# Altium integrated library C210 Rev_D.IntLib: 99 symbols (part 2 of 2)
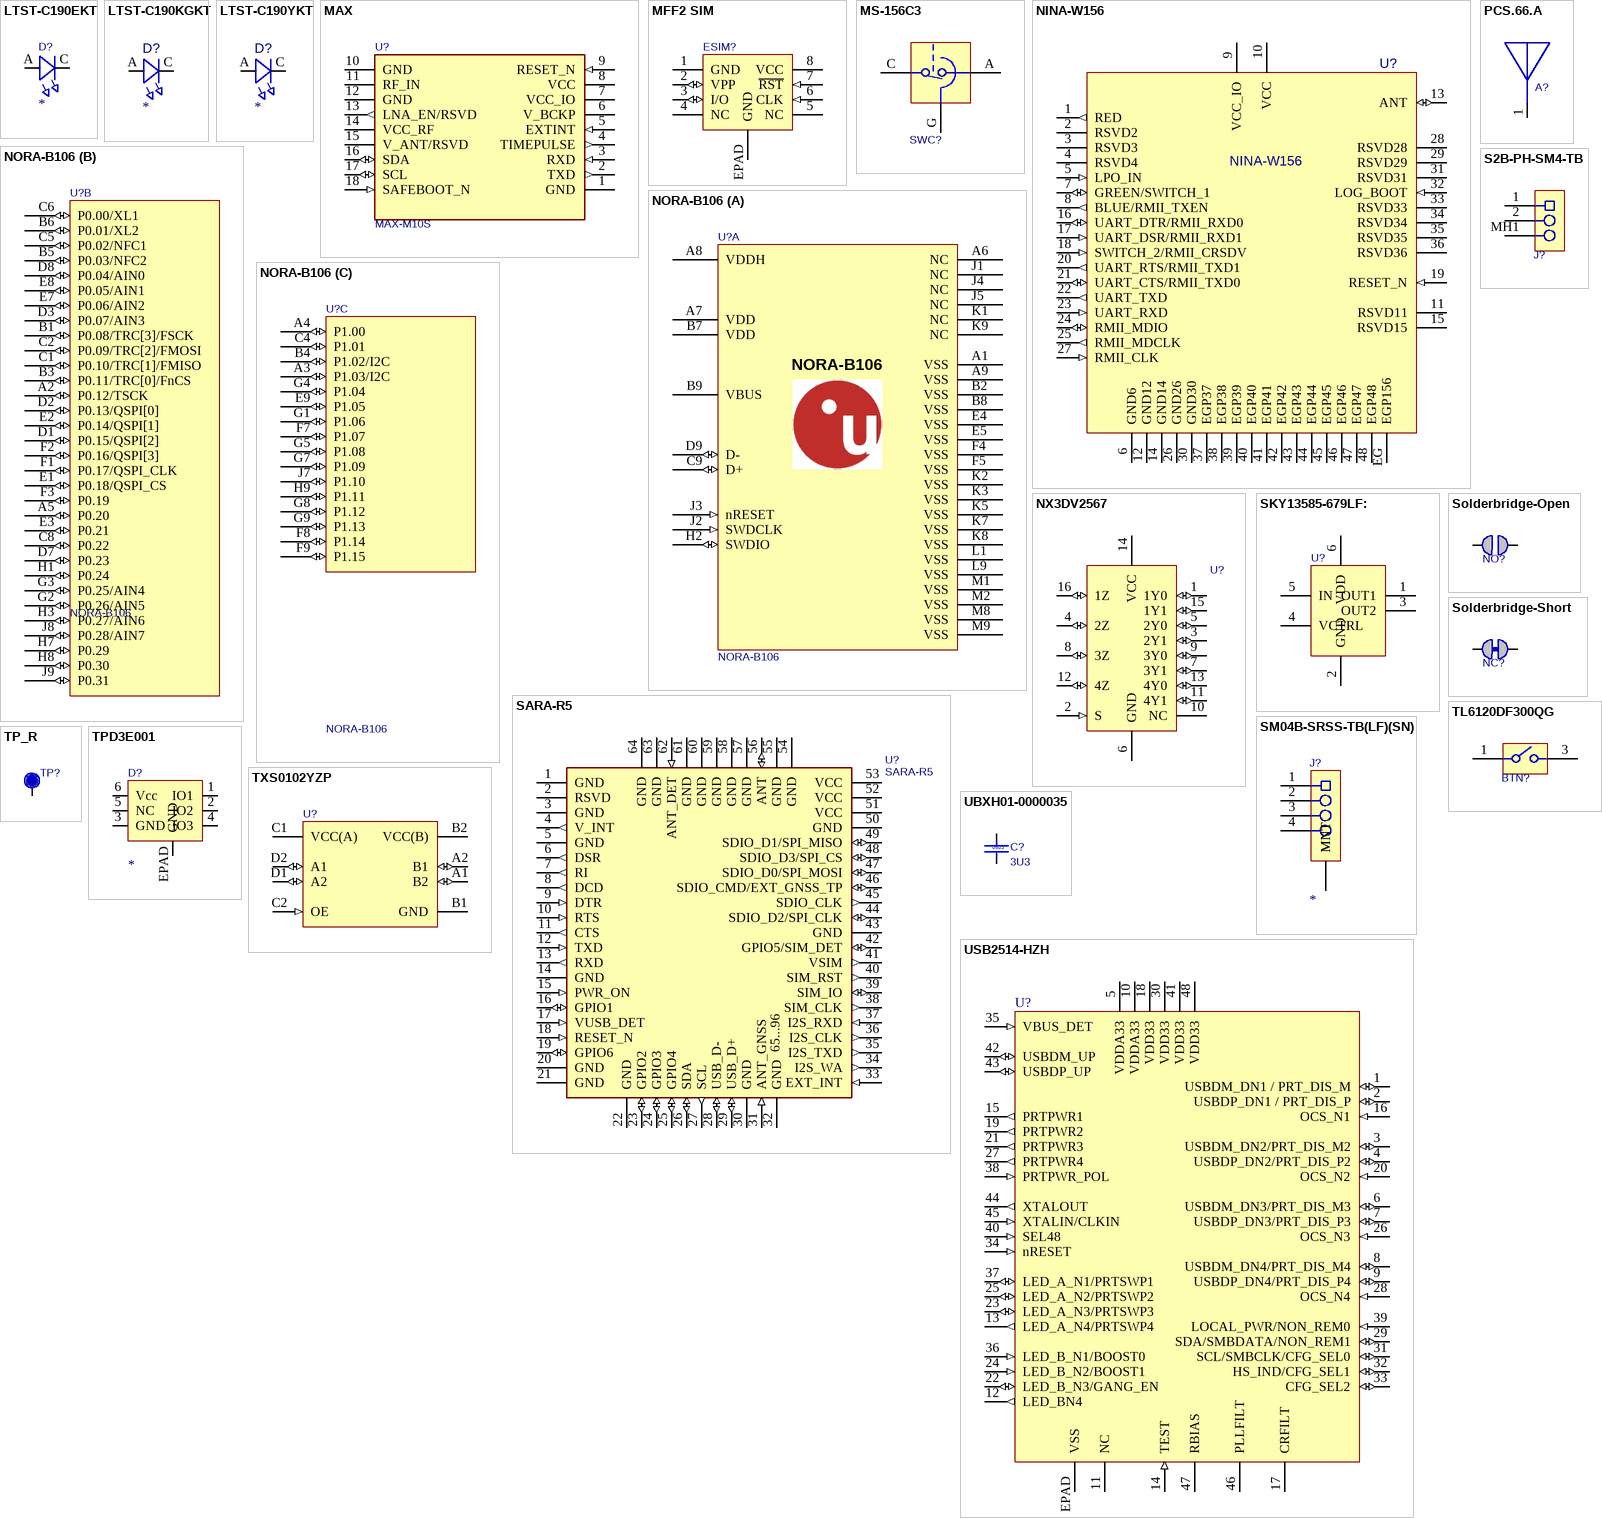
[diagram p3: symbols LTST-C190EKT to USB2514-HZH]

## NX3DV2567
designator U?
IC, ANLG SWITCH, 4PDT, SIM OPTIMIZED, 1.4V-4.3V, SMT, XQFN-16, 2.6mmX1.8mm; Part Number: NX3DV2567; Manufacturer 1: NXP USA Inc.; Manufacturer Part Number 1: NX3DV2567GU,115; Current: None; Item Phase: In Production; Use in new designs: Yes; Body Size: 2.6mm x 1.8mm; Height: 1mm; MFG Package: XQFN-16; Max Operating Temp: 85; Min Operating Temp: -40; Part Name: NX3DV2567GU,115; Pins: 16; Revision: 0A; Voltage: 1.4V-4.3V; UBX Code: None
footprint XQFN-16 (XQFN-16 0.4mm Pitch, 16 Pin, 2.6mm x 1.8mm)
pins: 1 1Y0 (io) "independent input or output (supply switch)", 2 S (in) "Control Input", 3 2Y1 (io) "independent input or output (data switch)", 4 2Z (io) "common output or input (data switch)", 5 2Y0 (io) "independent input or output (data switch)", 6 GND (power) "Ground", 7 3Y1 (io) "independent input or output (data switch)", 8 3Z (io) "common output or input (data switch)", 9 3Y0 (io) "independent input or output (data switch)", 10 NC "No Connect", 11 4Y1 (io) "independent input or output (data switch)", 12 4Z (io) "common output or input (data switch)", 13 4Y0 (io) "independent input or output (data switch)", 14 VCC (power) "Power Supply", 15 1Y1 (io) "independent input or output (supply switch)", 16 1Z (io) "common output or input (supply switch)"

## PCS.66.A
designator A?  (value not drawn)
RF Passive, Antenna, LTE, 600-6000MHz, Monopole; Manufacturer 1: Taoglas; Body Size: 33mm x 25mm; Item Phase: Unreleased; MFG Package: Custom; RF Freq: 698-2700 MHz; SMT Pitch: None; Use in new designs: Yes; Part Number: PCS.66.A; Manufacturer Part Number 1: PCS.66.A; Height: 1.6mm; Max Operating Temp: 85; Min Operating Temp: -40; Pins: 5; Revision: None; Size: Other; Voltage: None; UBX Code: None; Manufacturer 2: None; Manufacturer Part Number 2: None; Supplier 2: None; Supplier Part Number 2: None
footprint PCS.66.A (Taoglas PCS.66.A Cellular Antenna, 33x25x1.6mm)
pins: 1 "Feed"

## S2B-PH-SM4-TB
designator J?
Conn, SMT, 0.079" Pitch, 2 Pin, R/A, Black; Part Number: S2B-PH-SM4-TB; Item Phase: In Production; Use in new designs: Yes; Voltage: None; Manufacturer Part Number 1: S2B-PH-SM4-TB; Supplier 1: None; Supplier Part Number 1: None; Diameter: None; Height: 5.5mm; Max Operating Temp: None; Min Operating Temp: None; Part Name: Conn, SMT, 0.079" Pitch, 2 Pin, R/A, Black; Pins: 2; Revision: 0A; UBX Code: None; Manufacturer 2: None; Manufacturer Part Number 2: None; Supplier 2: None; Supplier Part Number 2: None; Manufacturer P/N: *
footprint S2B-PH-SM4-TB (Connector Header Surface Mount, Right Angle 2 position 0.079" (2.00mm))
pins: 1, 2, MH1

## SARA-R5
designator U?
GSM/GPRS and GSM/EGPRS/HSPA Cellular Module; Manufacturer: u-blox; Part Description: GSM/EGPRS/HSPA module; Manufacturer Part Number 1: SARA-R510S-01B-00; Value: SARA-R5; Manufacturer 1: u-blox
footprint SARA-XX (GSM/GPRS and GSM/EGPRS/HSPA   Cellular Module)
pins: 1 GND (power) "Ground", 2 RSVD "Reserved pin, Leave un-connected", 3 GND (power) "Ground", 4 V_INT (out) "Generic Digital Interfaces supply output", 5 GND (power) "Ground", 6 DSR (out) "UART data set ready/AUX UART request to send", 7 RI (out) "UART ring indicator / AUX UART clear to send", 8 DCD (out) "UART data carrier detect / AUX UART Output", 9 DTR (in) "UART Data Terminal Ready / AUX Uart data input", 10 RTS (in) "UART request to send", 11 CTS (out) "UART clear to send", 12 TXD (in) "UART data input", 13 RXD (out) "UART data output", 14 GND (power) "Ground", 15 PWR_ON (in) "Power on input, internal active pull-up", 16 GPIO1 (io) "Configurable GPIO", 17 VUSB_DET (in) "USB detect input", 18 RESET_N (in) "External reset input, internal active pull-up", 19 GPIO6 (io) "GPIO / Time pulse output", 20 GND (power) "Ground", 21 GND (power) "Ground", 22 GND (power) "Ground", 23 GPIO2 (io) "Configurable GPIO", 24 GPIO3 (io) "Configurable GPIO", 25 GPIO4 (io) "Configurable GPIO / External GNSS timestamp of external input", 26 SDA (io) "I2C bus data line", 27 SCL (out) "I2C bus clock line", 28 USB_D- (io) "USB data line D-", 29 USB_D+ (io) "USB data line D+", 30 GND (power) "Ground", 31 ANT_GNSS (in) "GNSS Antenna input", 32 GND (power) "Ground", 33 EXT_INT (in) "External input", 34 I2S_WA (out) "I2S word alignment / pin for dynamic tuning", 35 I2S_TXD (out) "I2S transmit data / pin for dynamic tuning", 36 I2S_CLK (out) "I2S Clock output", 37 I2S_RXD (in) "I2S receive data", 38 SIM_CLK (out) "SIM clock", 39 SIM_IO (io) "SIM bidirectional data", 40 SIM_RST (out) "SIM reset", 41 VSIM (out) "SIM supply output", 42 GPIO5/SIM_DET (io) "Configurable GPIO / SIM detect input", 43 GND (power) "Ground", 44 SDIO_D2/SPI_CLK (io) "SDIO Data 2 /  SPI clock output", 45 SDIO_CLK (out) "SDIO clock", 46 SDIO_CMD/EXT_GNSS_TP (io) "SDIO command / external GNSS time pulse input", 47 SDIO_D0/SPI_MOSI (io) "SDIO serial data 0 / SPI MOSI", 48 SDIO_D3/SPI_CS (io) "SDIO serial data 3 / SPI chip select (active low)", 49 SDIO_D1/SPI_MISO (io) "SDIO serial data 1 / SPI MISO", 50 GND (power) "Ground", 51 VCC (power) "Module supply input", 52 VCC (power) "Module supply input", 53 VCC (power) "Module supply input", 54 GND (power) "Ground", 55 GND (power) "Ground", 56 ANT (io) "Cellular antenna", 57 GND (power) "Ground", 58 GND (power) "Ground", 59 GND (power) "Ground", 60 GND (power) "Ground", 61 GND (power) "Ground", 62 ANT_DET (in) "Antenna detection", 63 GND (power) "Ground", 64 GND (power) "Ground", 65 GND, 66 GND, 67 GND, 68 GND, 69 GND, 70 GND, 71 GND, 72 GND, 73 GND, 74 GND, 75 GND, 76 GND, 77 GND, 78 GND, 79 GND, 80 GND, 81 GND, 82 GND, 83 GND, 84 GND, 85 GND, 86 GND, 87 GND, 88 GND, 89 GND, 90 GND, 91 GND, 92 GND, 93 GND, 94 GND, 95 GND, 96 GND
text: 65...96

## SKY13585-679LF:
designator U?
RF SWITCH, SPDT, I2C, 3-AXIS, 3-5V, 1-6GHz, SMT, DFN-6, 1mmX1mm; Part Number: SKY13585-679LF:; Manufacturer 1: ST Micro; Part Name: LIS3MDL; Body Size: 2mm x 2mm; Current: None; Item Phase: In Production; MFG Package: LGA-12; Use in new designs: Yes; Voltage: 1.9-3.6V; Manufacturer Part Number 1: SKY13585-679LF:; Height: 1mm; Max Operating Temp: 85; Min Operating Temp: -40; Pins: 12; Revision: 0A; UBX Code: None
footprint SKY13585-679LF (LGA 0.35mm Pitch, DFN-6 w/pad 2 underpad, 6 Pin, 1.0mm x 1.0mm)
pins: 1 OUT1 "RF Port", 2 GND (power), 3 OUT2 "RF Port", 4 VCTRL (power) "DC Control Voltage", 5 IN "RF Port", 6 VDD (power) "DC Supply Voltage"

## SM04B-SRSS-TB(LF)(SN)
designator J?
Conn, Header, SMD, 1mm Pitch, 4 Pin, R/A, White; Part Number: SM04B-SRSS-TB(LF)(SN); Manufacturer 1: JST Sales America Inc.; Part Name: CONN HEADER SMD R/A 4POS 1MM; Item Phase: In Production; Use in new designs: Yes; Voltage: None; Manufacturer Part Number 1: SM04B-SRSS-TB(LF)(SN); Supplier 1: None; Supplier Part Number 1: None; Diameter: None; Height: 2.9mm; Max Operating Temp: None; Min Operating Temp: None; Pins: 4; Revision: 0A; UBX Code: None; Manufacturer 2: None; Manufacturer Part Number 2: None; Supplier 2: None; Supplier Part Number 2: None; Manufacturer P/N: *
footprint SM04B-SRSS-TB(LF)(SN) (CONN HEADER SMD R/A 4POS 1MM)
pins: 1, 2, 3, 4, M1 MNT, M2 MNT

## Solderbridge-Open
designator NO?, comment Solderbridge-OpenDNP  (value not drawn)  (no BOM)
Solderbridge-Open; Added By: Paul B; Part Number: Solderbridge-Open; Height: 0; DNP: DNP; Added Date: 12/2/2015
footprint Solderbridge-Open
pins: 1, 2

## Solderbridge-Short
designator NC?, comment Solderbridge-ShortDNP  (value not drawn)  (net tie, no BOM)
Solderbridge-Short; Added By: Paul B; Part Number: Solderbridge-Short; Height: 0; DNP: DNP; Added Date: 12/2/2015
footprint Solderbridge-Short
pins: 1, 2

## TL6120DF300QG
designator BTN?
Button, Tactile, SPST, NO, SMT, Vert; Part Number: TL6120DF300QG; Manufacturer 1: E-Switch; Part Name: CON HDR 0.1" 3 Pin 1 Row SMT R/A; Item Phase: In Production; Use in new designs: Yes; Voltage: None; Manufacturer Part Number 1: TL6120DF300QG; Supplier 1: None; Supplier Part Number 1: None; Diameter: None; Height: 3.05mm; Max Operating Temp: None; Min Operating Temp: None; Pins: 3; Revision: 0A; UBX Code: None; Manufacturer 2: E-Switch; Manufacturer Part Number 2: TL6120DF500QG; Supplier 2: None; Supplier Part Number 2: None; Manufacturer P/N: *
footprint TL6120DF300QG (Button, Tactile, SPST, NO, Surface Mount)
pins: 1, 2, 3, 4

## TP_R
designator TP?, comment TP  (value not drawn)  (no BOM)
Testpoint, Round 1.0mm Dia; Part Number: TP10R; Added By: Jeremy D; Size: 1.0mm; Height: 0; DNP: DNP; Added Date: 2/1/2015; Checked By: Paul B; Checked Date: 2/5/2015
footprint TP12R (Testpoint, Round 1.2mm Dia)
pins: 1

## TPD3E001
designator D?
TVS Diode, ESD High Speed 3-Channel Array, WSON-6, 3mmX3mm; Manufacturer 1: Texas Instruments; Manufacturer Part Number 1: TPD3E001DRSR; Part Name: Diode TVS 5V 3CH WSON-6; Current: None; Item Phase: In Production; MFG Package: WSON-6, DRS (S-PWSON-N6); Use in new designs: Yes; Voltage: 5.5V; Manufacturer 2: None; Manufacturer Part Number 2: None; Supplier 2: None; Supplier Part Number 2: None; Body Size: 3mm x 3mm; Height: 0.80mm; Max Operating Temp: 85; Min Operating Temp: -40; Pins: 6; Revision: 0A; UBX Code: None; Manufacturer P/N: *
footprint TPD3E001DRSR (TI DSR Package - WSON-6 0.95mm Pitch, 6 Pin w/ EPAD, 3.0mm x 3.0mm)
pins: 1 IO1, 2 IO2, 3 GND (power), 4 IO3, 5 NC, 6 Vcc (power), EPAD GND (power)

## TXS0102YZP
designator U?
IC, SMT, LEVEL TRANSLATOR, DUAL, BIDIRECTIONAL, DSBGA-8 1.9mmX0.9mm; Part Number: TXS0102YZP; Manufacturer 1: Texas Instruments; Manufacturer Part Number 1: TXS0102YZPT; Current: None; Item Phase: In Production; Use in new designs: Yes; Manufacturer 2: Texas Instruments; Manufacturer Part Number 2: TXS0102YZPR; Body Size: 1.9mm x 0.9mm; Height: 0.65mm; MFG Package: DSBGA-8; Max Operating Temp: 85; Min Operating Temp: -40; Part Name: TXS0102YZP; Pins: 8; Revision: 0A; Voltage: N/A; UBX Code: None
footprint TXS0102YZP (8-DSBGA, 8 pin Texas Instruments TXS0102 dual level translator, .5mm pitch, 1.9mmX0.9mm)
pins: A1 B2 (io) "Input/output B. Referenced to VCCB", A2 B1 (io) "Input/output B. Referenced to VCCB", B1 GND (power) "Ground", B2 VCC(B) (power) "B-port supply voltage. 2.3 V ≤ VCCB ≤ 5.5 V", C1 VCC(A) (power) "A-port supply voltage. 1.65 V ≤ VCCA ≤ 3.6 V and VCCA ≤ VCC", C2 OE (in) "Output enable (active High). Pull OE low to place all outputs in 3-state", D1 A2 (io) "Input/output A. Referenced to VCCA.", D2 A1 (io) "Input/output A. Referenced to VCCA."

## UBXH01-0000035
designator C?  value 3U3  Size: 0603
CAP CER X5R 0603 3U3 10% 10V; Part Number: UBXH01-0000035; Manufacturer: Murata Manufacturing Company, Ltd.; Manufacturer P/N: GRM188R61A335KE15; Editor: dario.antonaz; Released by: karel.cotic; Env: ROHS; Permitted Use: Volume Products; Perferred: PREF; Mfg P/N Status: NRND; Mfg P/N Split: 100; Mfg P/N Released: Yes; Tolerance: 10%; Max Voltage: 10V; Part Type: Capacitor; Release Data: 2011-07-12T16:43:12; UBX Wiki: https://wiki.u-blox.com/bin/view/Operations/PartDetails?index=15220; RefDes: C; Mfg P/N Datasheet: https://wiki.u-blox.com/bin/view/Generic/Docs/DocumentSummary?index=15218; Manufacturer 2: Samsung Electro-Mechanics; Manufacturer P/N 2: CL10A335KP8NNN; Mfg P/N Status 2: Active; Mfg P/N Split 2: 0; Mfg P/N Released 2: Yes; Mfg P/N Datasheet 2: https://wiki.u-blox.com/bin/view/Generic/Docs/DocumentSummary?index=28127
simulation model CAP (Semiconductor Capacitor)
signal-integrity model Cap Semi
footprint Cap 0603 HD
footprint Cap 0603
pins: 1, 2

## USB2514-HZH
designator U?
4-PORT USB 2.0 HUB CTRLR, QFN-48, 7.0mmx7.0mm; Part Number: USB2514-HZH; Manufacturer 1: SMSC; Current: None; Item Phase: In Production; Use in new designs: Yes; Manufacturer Part Number 1: USB2514-HZH; Body Size: 7.0mm x 7.0mm; Height: 1.0mm; MFG Package: QFN-48; Max Operating Temp: 70; Min Operating Temp: 0; Part Name: USB2514-HZH; Pins: 48; Revision: 0A; Voltage: N/A; UBX Code: None
footprint QFN0.5P7.0x7.0-48Pin_EPAD (QFN 48Pin, 0.5mm pitch, 7.0mm x 7.0mm x 0.5mm, High Density)
pins: 1 USBDM_DN1 / PRT_DIS_M (io), 2 USBDP_DN1 / PRT_DIS_P (io), 3 USBDM_DN2/PRT_DIS_M2 (io), 4 USBDP_DN2/PRT_DIS_P2 (io), 5 VDDA33, 6 USBDM_DN3/PRT_DIS_M3 (io), 7 USBDP_DN3/PRT_DIS_P3 (io), 8 USBDM_DN4/PRT_DIS_M4 (io), 9 USBDP_DN4/PRT_DIS_P4 (io), 10 VDDA33, 11 NC "No Connect", 12 LED_BN4 (out) "Enhanced indicator port LED", 13 LED_A_N4/PRTSWP4 (out) "Enhanced indicator port LED", 14 TEST (in) "Test Pin", 15 PRTPWR1 (out) "USB Port Enable", 16 OCS_N1 (in) "Over-Current Sense", 17 CRFILT "Core regulator filter capacitor", 18 VDD33 (power) "3.3V Power", 19 PRTPWR2 (out) "USB Port Enable", 20 OCS_N2 (in) "Over-Current Sense", 21 PRTPWR3 (out) "USB Port Enable", 22 LED_B_N3/GANG_EN (io) "Enhanced indicator port LED/ganged port poer strap option", 23 LED_A_N3/PRTSWP3 (io) "Indicator port LED/ganged port poer strap option", 24 LED_B_N2/BOOST1 (in) "Boost strapping option 1", 25 LED_A_N2/PRTSWP2 (io) "Enhanced indicator port LED/ganged port poer strap option", 26 OCS_N3 (in) "Over-Current Sense", 27 PRTPWR4 (out) "USB Port Enable", 28 OCS_N4 (in) "Over-Current Sense", 29 SDA/SMBDATA/NON_REM1 (io) "I2C/SMB data", 30 VDD33 (power) "3.3V Power", 31 SCL/SMBCLK/CFG_SEL0 (io) "I2C/SMB clock", 32 HS_IND/CFG_SEL1 (io) "High speed upstream USB indicator/configuration programming selection", 33 CFG_SEL2 (io) "Configuration programming selection", 34 nRESET (in) "logic low reset input", 35 VBUS_DET (in) "USB VBUS detect input", 36 LED_B_N1/BOOST0 (in) "Boost strapping option 0", 37 LED_A_N1/PRTSWP1 (io) "Indicator port LED, Port swap strapping input", 38 PRTPWR_POL (in) "Port power polarity strapping", 39 LOCAL_PWR/NON_REM0 (in) "Local power detection/non-removable strapping pin 0", 40 SEL48 (in) "Select 48MHz input", 41 VDD33 (power) "3.3V Power", 42 USBDM_UP (io) "USB Upstream D-", 43 USBDP_UP (io) "USB Upstream data D+", 44 XTALOUT (out) "Crystal Output", 45 XTALIN/CLKIN (in) "Crystal Input / External clock input", 46 PLLFILT "PLL filter capacitor", 47 RBIAS "USB transceiver bias resistor", 48 VDD33 (power) "3.3V Power", EPAD VSS "USB transceiver bias resistor"